# Altium footprint library Library 3D.PcbLib: 288 footprints (part 14 of 18)
Each footprint in its own frame and in the unit in brackets; x right, y up, seen from the top. Pads: shape width x height; smd on the part's side, far side on the other; paste and mask are expansions set on the pad; w line width, h text height; cw(c..) or ccw(c..) is an arc to the next point about the centre after c.
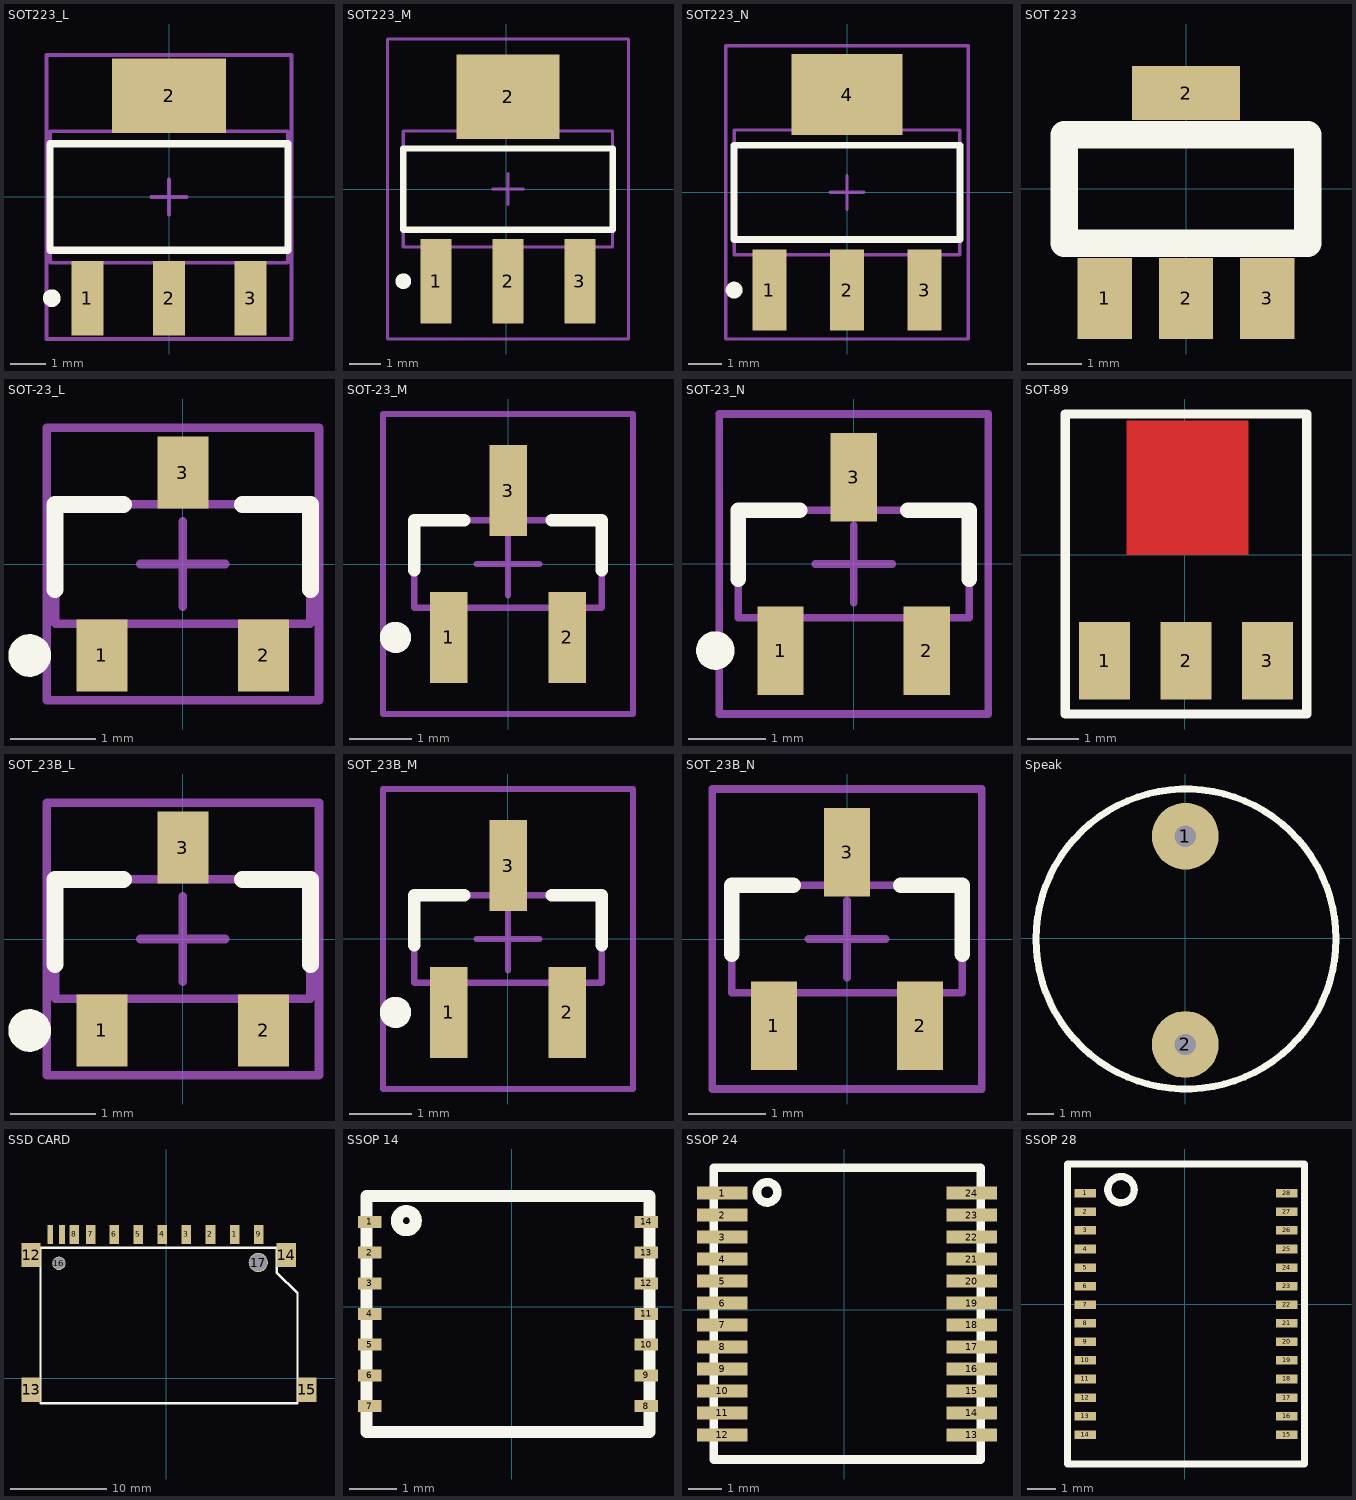
[diagram p13: the footprints below, top view; thin cyan lines are the x and y axes]

## SOT223_L [mm]
pads (4):
  rect 0.9x2.1 smd: 1(-2.3,-2.85) 2(0,-2.85) 3(2.3,-2.85)
  rect 3.2x2.1 smd: 2(0,2.85)
Top Overlay:
  circle w0.25: c-3.3,-2.85 r0.125
  lines w0.2: -3.35,-1.5 -3.35,1.5 3.35,1.5 3.35,-1.5 -3.35,-1.5
Mechanical 13:
  lines w0.1: -3.35,-1.85 -3.35,1.85 3.35,1.85 3.35,-1.85 -3.35,-1.85
Mechanical 15:
  lines w0.1: -0.5,0 0.5,0 ; 0,-0.5 0,0.5 ; -3.45,-4 -3.45,4 3.45,4 3.45,-4 -3.45,-4
3D body "SW3dPS-SOT-223-1.STEP": height 1.59, standoff -0.06, extent -3.25,-3.551 3.25,3.449

## SOT223_M [mm]
pads (4):
  rect 1x2.7 smd: 1(-2.249,-2.95) 2(0.051,-2.95) 3(2.351,-2.95)
  rect 3.3x2.7 smd: 2(0.051,2.95)
Top Overlay:
  circle w0.25: c-3.299,-2.95 r0.125
  lines w0.2: -3.299,-1.3 -3.299,1.3 3.401,1.3 3.401,-1.3 -3.299,-1.3
Mechanical 13:
  lines w0.1: -3.299,-1.85 -3.299,1.85 3.401,1.85 3.401,-1.85 -3.299,-1.85
Mechanical 15:
  lines w0.1: -0.449,0 0.551,0 ; 0.051,-0.5 0.051,0.5 ; -3.799,-4.8 -3.799,4.8 3.901,4.8 3.901,-4.8 -3.799,-4.8
3D body "SW3dPS-SOT-223-1.STEP": height 1.89, standoff 0.24, extent -3.225,-3.475 3.275,3.525

## SOT223_N [mm]
pads (4):
  rect 1x2.4 smd: 1(-2.3,-2.9) 2(0,-2.9) 3(2.3,-2.9)
  rect 3.3x2.4 smd: 4(0,2.9)
Top Overlay:
  circle w0.25: c-3.35,-2.9 r0.125
  lines w0.2: -3.35,-1.4 3.35,-1.4 3.35,1.4 -3.35,1.4 -3.35,-1.4
Mechanical 13:
  lines w0.1: -3.35,-1.85 3.35,-1.85 3.35,1.85 -3.35,1.85 -3.35,-1.85
Mechanical 15:
  lines w0.1: -0.5,0 0.5,0 ; 0,-0.5 0,0.5 ; -3.6,-4.35 3.6,-4.35 3.6,4.35 -3.6,4.35 -3.6,-4.35
3D body "SW3dPS-SOT-223-1.STEP": height 1.89, standoff 0.24, extent -3.275,-3.525 3.225,3.475

## SOT 223 [mm]
pads (4):
  rect 1x1.5 smd: 1(-1.5,-2.02) 2(0,-2.02) 3(1.5,-2.02)
  rect 2x1 smd: 2(0,1.77)
Top Overlay:
  lines w0.508: -2.25,-1 2.25,-1 2.25,1 -2.25,1 -2.25,-1
3D body "78L05.STEP": height 1.5, standoff 0, extent -2.25,-2.27 2.25,1.92

## SOT-23_L [mm]
pads (3):
  rect 0.6x0.85 smd: 1(-0.95,-1.075) 2(0.95,-1.075) 3(0,1.075)
Top Overlay:
  circle w0.25: c-1.8,-1.075 r0.125
  lines w0.2: -1.5,-0.3 -1.5,0.7 -0.7,0.7 ; 0.7,0.7 1.5,0.7 1.5,-0.3
Mechanical 13:
  lines w0.1: -1.5,-0.7 -1.5,0.7 1.5,0.7 1.5,-0.7 -1.5,-0.7
Mechanical 15:
  lines w0.1: -0.5,0 0.5,0 ; 0,-0.5 0,0.5 ; -1.6,-1.6 -1.6,1.6 1.6,1.6 1.6,-1.6 -1.6,-1.6
3D body: height 1.1, standoff 0, extent -1.5,-0.7 1.5,0.7

## SOT-23_M [mm]
pads (3):
  rect 0.6x1.45 smd: 1(-0.95,-1.175) 2(0.95,-1.175) 3(0,1.175)
Top Overlay:
  circle w0.25: c-1.8,-1.175 r0.125
  lines w0.2: -1.5,-0.1 -1.5,0.7 -0.7,0.7 ; 0.7,0.7 1.5,0.7 1.5,-0.1
Mechanical 13:
  lines w0.1: -1.5,-0.7 1.5,-0.7 1.5,0.7 -1.5,0.7 -1.5,-0.7
Mechanical 15:
  lines w0.1: -0.5,0 0.5,0 ; 0,-0.5 0,0.5 ; -2,-2.4 2,-2.4 2,2.4 -2,2.4 -2,-2.4
3D body: height 1.1, standoff 0, extent -1.5,-0.7 1.5,0.7

## SOT-23_N [mm]
pads (3):
  rect 0.6x1.15 smd: 1(-0.95,-1.125) 2(0.95,-1.125) 3(0,1.125)
Top Overlay:
  circle w0.25: c-1.8,-1.125 r0.125
  lines w0.2: -1.5,-0.2 -1.5,0.7 -0.7,0.7 ; 0.7,0.7 1.5,0.7 1.5,-0.2
Mechanical 13:
  lines w0.1: -1.5,-0.7 1.5,-0.7 1.5,0.7 -1.5,0.7 -1.5,-0.7
Mechanical 15:
  lines w0.1: -0.5,0 0.5,0 ; 0,-0.5 0,0.5 ; -1.75,-1.95 1.75,-1.95 1.75,1.95 -1.75,1.95 -1.75,-1.95
3D body: height 1.1, standoff 0, extent -1.5,-0.7 1.5,0.7

## SOT-89 [mm]
pads (3):
  rect 1x1.524 smd: 1(-1.573,-2.079) 2(0.027,-2.079) 3(1.627,-2.079)
Top Layer:
  rectangle: -1.148,-0.004 1.252,2.646
Top Overlay:
  lines w0.178: -2.348,-3.129 -2.348,2.771 2.402,2.771 2.402,-3.129 -2.348,-3.129
3D body "User Library-SOT-89-1.step": height 1.51, standoff 0, extent -2.223,-2.304 2.277,1.996

## SOT_23B_L [mm]
pads (3):
  rect 0.6x0.85 smd: 1(-0.95,-1.075) 2(0.95,-1.075) 3(0,1.075)
Top Overlay:
  circle w0.25: c-1.8,-1.075 r0.125
  lines w0.2: -1.5,-0.3 -1.5,0.7 -0.7,0.7 ; 0.7,0.7 1.5,0.7 1.5,-0.3
Mechanical 13:
  lines w0.1: -1.5,-0.7 1.5,-0.7 1.5,0.7 -1.5,0.7 -1.5,-0.7
Mechanical 15:
  lines w0.1: -0.5,0 0.5,0 ; 0,-0.5 0,0.5 ; -1.6,-1.6 1.6,-1.6 1.6,1.6 -1.6,1.6 -1.6,-1.6
3D body: height 1.14, standoff 0, extent -1.5,-0.7 1.5,0.7

## SOT_23B_M [mm]
pads (3):
  rect 0.6x1.45 smd: 1(-0.95,-1.175) 2(0.95,-1.175) 3(0,1.175)
Top Overlay:
  circle w0.25: c-1.8,-1.175 r0.125
  lines w0.2: -1.5,-0.1 -1.5,0.7 -0.7,0.7 ; 0.7,0.7 1.5,0.7 1.5,-0.1
Mechanical 13:
  lines w0.1: -1.5,-0.7 1.5,-0.7 1.5,0.7 -1.5,0.7 -1.5,-0.7
Mechanical 15:
  lines w0.1: -0.5,0 0.5,0 ; 0,-0.5 0,0.5 ; -2,-2.4 2,-2.4 2,2.4 -2,2.4 -2,-2.4
3D body: height 1.14, standoff 0, extent -1.5,-0.7 1.5,0.7

## SOT_23B_N [mm]
pads (3):
  rect 0.6x1.15 smd: 1(-0.95,-1.125) 2(0.95,-1.125) 3(0,1.125)
Top Overlay:
  lines w0.2: -1.5,-0.2 -1.5,0.7 -0.7,0.7 ; 0.7,0.7 1.5,0.7 1.5,-0.2
Mechanical 13:
  lines w0.1: -1.5,-0.7 -1.5,0.7 1.5,0.7 1.5,-0.7 -1.5,-0.7
Mechanical 15:
  lines w0.1: -0.5,0 0.5,0 ; 0,-0.5 0,0.5 ; -1.75,-1.95 -1.75,1.95 1.75,1.95 1.75,-1.95 -1.75,-1.95
3D body: height 1.14, standoff 0, extent -1.5,-0.7 1.5,0.7

## Speak [mm]
pads (2):
  round 2.5 hole 0.8: 1(0,3.825) 2(0,-3.975)
Top Overlay:
  circle w0.254: c0.025,-0.025 r5.616
3D body "Loa.STEP": height 9.65, standoff -4.35, extent -5.625,-5.675 5.675,5.625

## SSD CARD [mm]
pads (17):
  rect 1x2 smd: 1(7.082,14.947) 2(4.582,14.947) 3(2.082,14.947) 4(-0.418,14.947) 5(-2.918,14.947) 6(-5.418,14.947) 7(-7.843,14.947) 8(-9.543,14.947) 9(9.582,14.947)
  rect 0.6x2 smd: 10(-10.843,14.947) 11(-12.043,14.947)
  rect 2x2.5 smd: 12(-14.043,12.788) 13(-14.043,-1.182) 14(12.436,12.788) 15(14.595,-1.182)
  round 1.4 hole 1.2: 16(-11.143,11.947)
  round 2 hole 1.8: 17(9.547,12.026)
Top Overlay:
  lines w0.254: -13.059,-2.579 -13.059,13.55 11.452,13.55 11.452,11.01 13.611,8.851 13.611,-2.579 -13.059,-2.579
3D body "User Library-SD Kart.step": height 3, standoff -1, extent -14.126,-15.256 14.474,14.744

## SSOP 14 [mm]
pads (14):
  rect 0.5x0.254 smd: 1(-3,1.8) 2(-3,1.15) 3(-3,0.5) 4(-3,-0.15) 5(-3,-0.8) 6(-3,-1.45) 7(-3,-2.1) 8(2.85,-2.1) 9(2.85,-1.45) 10(2.85,-0.8) 11(2.85,-0.15) 12(2.85,0.5) 13(2.85,1.15) 14(2.85,1.8)
Top Overlay:
  circle w0.254: c-2.227,1.825 r0.202
  lines w0.254: -3.075,-2.65 -3.075,2.35 2.925,2.35 2.925,-2.65 -3.075,-2.65
3D body "User Library-SSOP14-P065.STEP": height 1.73, standoff -0.08, extent -3.075,-2.65 2.925,2.35

## SSOP 24 [mm]
pads (24):
  rect 1.5x0.38 smd: 1(-3.6,3.45) 2(-3.6,2.8) 3(-3.6,2.15) 4(-3.6,1.5) 5(-3.6,0.85) 6(-3.6,0.2) 7(-3.6,-0.45) 8(-3.6,-1.1) 9(-3.6,-1.75) 10(-3.6,-2.4) 11(-3.6,-3.05) 12(-3.6,-3.7) 13(3.775,-3.7) 14(3.775,-3.05) 15(3.775,-2.4) 16(3.775,-1.75) 17(3.775,-1.1) 18(3.775,-0.45) 19(3.775,0.2) 20(3.775,0.85) 21(3.775,1.5) 22(3.775,2.15) 23(3.775,2.8) 24(3.775,3.45)
Top Overlay:
  circle w0.254: c-2.276,3.475 r0.301
  lines w0.254: -3.85,-4.43 4.05,-4.43 4.05,4.2 -3.85,4.2 -3.85,-4.43
3D body "User Library-SSOP 24 PIN_.STEP": height 1.93, standoff -0.06, extent -3.85,-4.43 4.05,4.2

## SSOP 28 [mm]
pads (28):
  rect 0.75x0.3 smd: 1(-3.475,3.875) 2(-3.475,3.225) 3(-3.475,2.575) 4(-3.475,1.925) 5(-3.475,1.275) 6(-3.475,0.625) 7(-3.475,-0.025) 8(-3.475,-0.675) 9(-3.475,-1.325) 10(-3.475,-1.975) 11(-3.475,-2.625) 12(-3.475,-3.275) 13(-3.475,-3.925) 14(-3.475,-4.575) 15(3.575,-4.575) 16(3.575,-3.925) 17(3.575,-3.275) 18(3.575,-2.625) 19(3.575,-1.975) 20(3.575,-1.325) 21(3.575,-0.675) 22(3.575,-0.025) 23(3.575,0.625) 24(3.575,1.275) 25(3.575,1.925) 26(3.575,2.575) 27(3.575,3.225) 28(3.575,3.875)
Top Overlay:
  circle w0.254: c-2.225,4 r0.461
  lines w0.254: -4.1,-5.6 4.2,-5.6 4.2,4.9 -4.1,4.9 -4.1,-2.725 -4.1,-5.6
3D body "User Library-SSOP-28-2.STEP": height 1.95, standoff -0.05, extent -3.85,-5.45 3.962,4.75